# Altium footprint library Reflow3D1411sep.PcbLib: 657 footprints (part 25 of 42)
Each footprint in its own frame and in the unit in brackets; x right, y up, seen from the top. Pads: shape width x height; smd on the part's side, far side on the other; paste and mask are expansions set on the pad; w line width, h text height; cw(c..) or ccw(c..) is an arc to the next point about the centre after c.
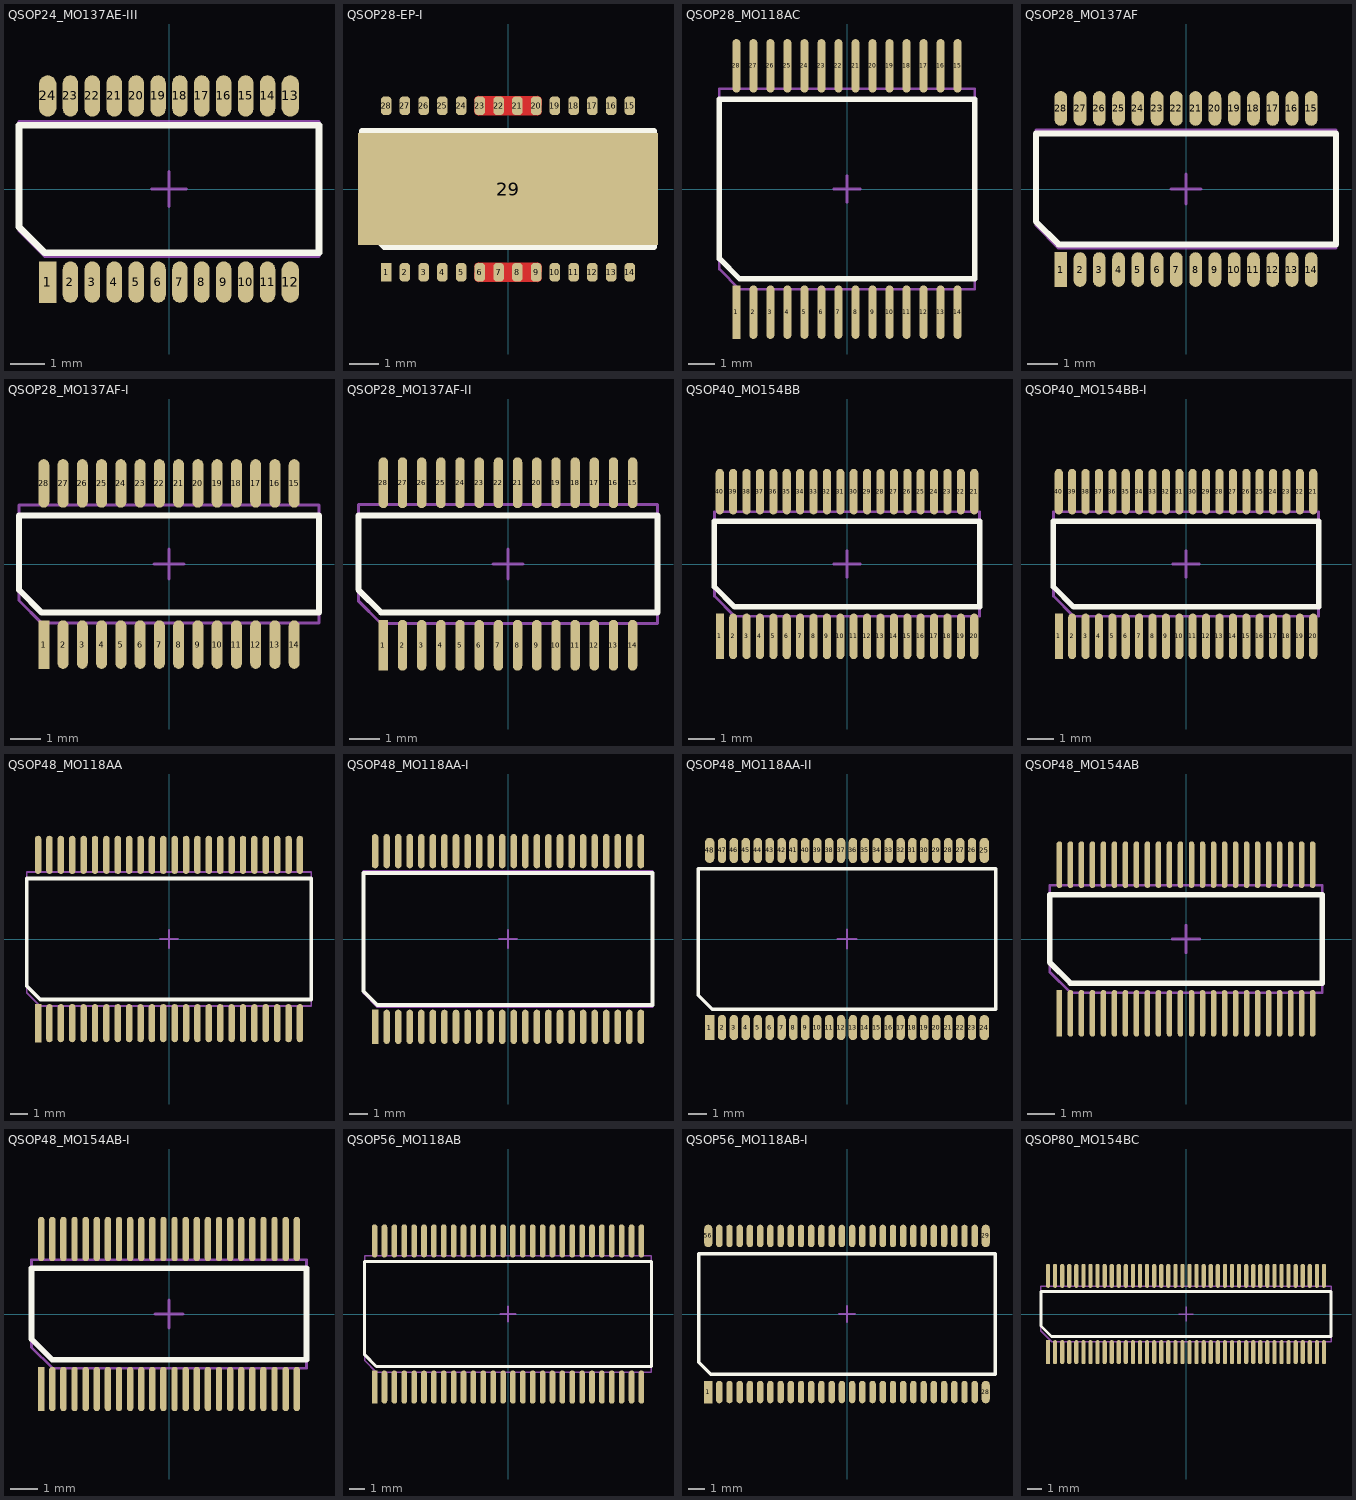
[diagram p24: the footprints below, top view; thin cyan lines are the x and y axes]

## QSOP24_MO137AE-III [mm] "www.nxp.com, sot724-1_po.pdf, SOT724-1_fp_reflow.pdf"
height 1.62
pads (24):
  rect 0.5x1.2 smd mask+0.075: 1(-3.518,-2.7)
  oval 0.45x1.2 smd mask+0.075: 2(-2.857,-2.7) 3(-2.222,-2.7) 4(-1.587,-2.7) 5(-0.953,-2.7) 6(-0.318,-2.7) 7(0.318,-2.7) 8(0.953,-2.7) 9(1.587,-2.7) 10(2.222,-2.7) 11(2.857,-2.7) 14(2.857,2.7) 15(2.222,2.7) 16(1.587,2.7) 17(0.953,2.7) 18(0.318,2.7) 19(-0.318,2.7) 20(-0.953,2.7) 21(-1.587,2.7) 22(-2.222,2.7) 23(-2.857,2.7)
  oval 0.5x1.2 smd mask+0.075: 12(3.518,-2.7) 13(3.518,2.7) 24(-3.518,2.7)
Top Overlay:
  lines w0.2: -4.35,-1.1 -4.35,1.85 4.35,1.85 4.35,-1.85 -3.6,-1.85 -4.35,-1.1
Top Solder:
  region: -0.665,-2.25 -0.665,-3.15 -0.605,-3.15 -0.605,-2.25
  region: -0.665,3.15 -0.665,2.25 -0.605,2.25 -0.605,3.15
  region: -0.03,3.15 -0.03,2.25 0.03,2.25 0.03,3.15
  region: -0.03,-2.25 -0.03,-3.15 0.03,-3.15 0.03,-2.25
  region: -3.195,-2.25 -3.195,-3.15 -3.145,-3.15 -3.145,-2.25
  region: -2.57,-2.25 -2.57,-3.15 -2.51,-3.15 -2.51,-2.25
  region: -1.935,-2.25 -1.935,-3.15 -1.875,-3.15 -1.875,-2.25
  region: 1.24,-2.25 1.24,-3.15 1.3,-3.15 1.3,-2.25
  region: 1.875,-2.25 1.875,-3.15 1.935,-3.15 1.935,-2.25
  region: 2.51,-2.25 2.51,-3.15 2.57,-3.15 2.57,-2.25
  region: -2.57,3.15 -2.57,2.25 -2.51,2.25 -2.51,3.15
  region: -1.935,3.15 -1.935,2.25 -1.875,2.25 -1.875,3.15
  region: 1.24,3.15 1.24,2.25 1.3,2.25 1.3,3.15
  region: 1.875,3.15 1.875,2.25 1.935,2.25 1.935,3.15
  region: 2.51,3.15 2.51,2.25 2.57,2.25 2.57,3.15
  region: -3.21,3.15 -3.21,2.25 -3.145,2.25 -3.145,3.15
  region: 3.21,2.25 3.21,3.15 3.145,3.15 3.145,2.25
  region: 3.21,-3.15 3.21,-2.25 3.145,-2.25 3.145,-3.15
  region: 0.605,3.15 0.605,2.25 0.665,2.25 0.665,3.15
  region: -1.3,3.15 -1.3,2.25 -1.24,2.25 -1.24,3.15
  region: 0.605,-2.25 0.605,-3.15 0.665,-3.15 0.665,-2.25
  region: -1.3,-2.25 -1.3,-3.15 -1.24,-3.15 -1.24,-2.25
Mechanical 13:
  lines w0.1: -4.35,-1.2 -3.6,-1.95 4.35,-1.95 4.35,1.95 -4.35,1.95 -4.35,-1.2
Mechanical 15:
  lines w0.1: -0.5,0 0.5,0 ; 0,-0.5 0,0.5
3D body: height 1.73, standoff 0, extent -4.4,-2 4.4,2

## QSOP28-EP-I [mm] "www.anadigics.com, Layout and Power Control for ARA05050.pdf"
height 1.6
pads (29):
  rect 0.36x0.64 smd paste-25.4 mask-25.4: 1(-4.127,-2.82)
  rrect75% 0.36x0.64 smd paste-25.4 mask-25.4: 2(-3.492,-2.82) 3(-2.857,-2.82) 4(-2.222,-2.82) 5(-1.587,-2.82) 6(-0.953,-2.82) 7(-0.318,-2.82) 8(0.318,-2.82) 9(0.953,-2.82) 10(1.587,-2.82) 11(2.222,-2.82) 12(2.857,-2.82) 13(3.492,-2.82) 14(4.127,-2.82) 15(4.127,2.82) 16(3.492,2.82) 17(2.857,2.82) 18(2.222,2.82) 19(1.587,2.82) 20(0.953,2.82) 21(0.318,2.82) 22(-0.318,2.82) 23(-0.953,2.82) 24(-1.587,2.82) 25(-2.222,2.82) 26(-2.857,2.82) 27(-3.492,2.82) 28(-4.127,2.82)
  rect 10.16x3.81 smd paste-25.4 mask-25.4: 29(0,0)
Top Layer:
  region: -1.144,2.635 -1.101,2.532 -0.998,2.489 -0.998,2.5 0.997,2.489 1.101,2.532 1.144,2.635 1.132,2.635 1.144,3.005 1.101,3.108 0.998,3.151 0.998,3.14 -0.998,3.151 -1.101,3.108 -1.144,3.005 -1.132,3.005
  region: 1.144,-2.635 1.101,-2.532 0.998,-2.489 0.998,-2.5 -0.997,-2.489 -1.101,-2.532 -1.144,-2.635 -1.132,-2.635 -1.144,-3.005 -1.101,-3.108 -0.997,-3.151 -0.997,-3.14 0.997,-3.151 1.101,-3.108 1.144,-3.005 1.132,-3.005
Top Overlay:
  lines w0.2: -4.94,-1.21 -4.94,1.96 4.94,1.96 4.94,-1.96 -4.19,-1.96 -4.94,-1.21
Top Paste:
  region: 4.283,2.525 4.283,3.05 3.972,3.05 3.972,2.525
  region: 3.647,2.525 3.647,3.05 3.337,3.05 3.337,2.525
  region: 3.012,2.525 3.012,3.05 2.702,3.05 2.702,2.525
  region: 2.377,2.525 2.377,3.05 2.067,3.05 2.067,2.525
  region: 1.742,2.525 1.742,3.05 1.432,3.05 1.432,2.525
  region: 1.108,2.525 1.108,3.05 -1.108,3.05 -1.108,2.525
  region: -1.433,2.525 -1.433,3.05 -1.743,3.05 -1.743,2.525
  region: -2.068,2.525 -2.068,3.05 -2.378,3.05 -2.378,2.525
  region: -2.703,2.525 -2.703,3.05 -3.013,3.05 -3.013,2.525
  region: -3.338,2.525 -3.338,3.05 -3.648,3.05 -3.648,2.525
  region: -3.973,2.525 -3.973,3.05 -4.283,3.05 -4.283,2.525
  region: 3.973,-2.525 3.973,-3.05 4.283,-3.05 4.283,-2.525
  region: 3.338,-2.525 3.338,-3.05 3.648,-3.05 3.648,-2.525
  region: 2.703,-2.525 2.703,-3.05 3.013,-3.05 3.013,-2.525
  region: 2.068,-2.525 2.068,-3.05 2.378,-3.05 2.378,-2.525
  region: 1.433,-2.525 1.433,-3.05 1.743,-3.05 1.743,-2.525
  region: -1.742,-2.525 -1.742,-3.05 -1.432,-3.05 -1.432,-2.525
  region: -2.377,-2.525 -2.377,-3.05 -2.067,-3.05 -2.067,-2.525
  region: -3.012,-2.525 -3.012,-3.05 -2.702,-3.05 -2.702,-2.525
  region: -3.647,-2.525 -3.647,-3.05 -3.337,-3.05 -3.337,-2.525
  region: -4.283,-2.525 -4.283,-3.05 -3.972,-3.05 -3.972,-2.525
  region: -1.525,-0.76 -1.525,0.76 1.525,0.76 1.525,-0.76
  region: -1.108,-2.525 -1.108,-3.05 1.108,-3.05 1.108,-2.525
Top Solder:
  drawing of 23 lines, arcs and shapes, not listed
Mechanical 13:
  lines w0.1: -1.525,-0.26 -1.525,-0.76 -1.025,-0.76 ; -1.525,0.26 -1.525,0.76 -1.025,0.76 ; 1.025,-0.76 1.525,-0.76 1.525,-0.26 ; 1.025,0.76 1.525,0.76 1.525,0.26 ; -4.94,-1.21 -4.94,1.96 4.94,1.96 4.94,-1.96 -4.19,-1.96 -4.94,-1.21
Mechanical 15:
  lines w0.1: -0.5,0 0.5,0 ; 0,-0.5 0,0.5
3D body: height 1.73, standoff 0, extent -4.99,-1.995 4.99,1.995

## QSOP28_MO118AC [mm] "www.ti.com, msso001c.pdf, DL28.asc; www.jedec.org, Mo-118b.pdf"
height 2.59
pads (28):
  rect 0.3x2 smd mask+0.075: 1(-4.127,-4.6)
  oval 0.3x2 smd mask+0.075: 2(-3.492,-4.6) 3(-2.857,-4.6) 4(-2.222,-4.6) 5(-1.587,-4.6) 6(-0.953,-4.6) 7(-0.318,-4.6) 8(0.318,-4.6) 9(0.953,-4.6) 10(1.587,-4.6) 11(2.222,-4.6) 12(2.857,-4.6) 13(3.492,-4.6) 14(4.127,-4.6) 15(4.127,4.6) 16(3.492,4.6) 17(2.857,4.6) 18(2.222,4.6) 19(1.587,4.6) 20(0.953,4.6) 21(0.318,4.6) 22(-0.318,4.6) 23(-0.953,4.6) 24(-1.587,4.6) 25(-2.222,4.6) 26(-2.857,4.6) 27(-3.492,4.6) 28(-4.127,4.6)
Top Overlay:
  lines w0.2: -4.765,-2.6 -4.015,-3.35 4.765,-3.35 4.765,3.35 -4.765,3.35 -4.765,-2.6
Mechanical 13:
  lines w0.1: -4.765,-2.995 -4.015,-3.745 4.765,-3.745 4.765,3.745 -4.765,3.745 -4.765,-2.995
Mechanical 15:
  lines w0.1: -0.5,0 0.5,0 ; 0,-0.5 0,0.5
3D body: height 2.79, standoff 0, extent -4.825,-3.795 4.825,3.795

## QSOP28_MO137AF [mm] "www.linear.com, SSOP_28_05-08-1641.pdf; www.jedec.org, mo-187e.pdf"
height 1.55
pads (28):
  rect 0.42x1.14 smd mask+0.05: 1(-4.127,-2.655)
  oval 0.42x1.14 smd mask+0.05: 2(-3.492,-2.655) 3(-2.857,-2.655) 4(-2.222,-2.655) 5(-1.587,-2.655) 6(-0.953,-2.655) 7(-0.318,-2.655) 8(0.318,-2.655) 9(0.953,-2.655) 10(1.587,-2.655) 11(2.222,-2.655) 12(2.857,-2.655) 13(3.492,-2.655) 14(4.127,-2.655) 15(4.127,2.655) 16(3.492,2.655) 17(2.857,2.655) 18(2.222,2.655) 19(1.587,2.655) 20(0.953,2.655) 21(0.318,2.655) 22(-0.318,2.655) 23(-0.953,2.655) 24(-1.587,2.655) 25(-2.222,2.655) 26(-2.857,2.655) 27(-3.492,2.655) 28(-4.127,2.655)
Top Overlay:
  lines w0.2: -4.945,-1.075 -4.945,1.825 4.945,1.825 4.945,-1.825 -4.195,-1.825 -4.945,-1.075
Mechanical 13:
  lines w0.1: -4.945,-1.2 -4.945,1.95 4.945,1.95 4.945,-1.95 -4.195,-1.95 -4.945,-1.2
Mechanical 15:
  lines w0.1: -0.5,0 0.5,0 ; 0,-0.5 0,0.5
3D body: height 1.75, standoff 0, extent -4.99,-1.995 4.99,1.995

## QSOP28_MO137AF-I [mm] "www.maxim-ic.com, 21-0055.PDF, 90-0173.PDF"
height 1.55
pads (28):
  rect 0.36x1.6 smd mask+0.075: 1(-4.127,-2.655)
  oval 0.36x1.6 smd mask+0.075: 2(-3.492,-2.655) 3(-2.857,-2.655) 4(-2.222,-2.655) 5(-1.587,-2.655) 6(-0.953,-2.655) 7(-0.318,-2.655) 8(0.318,-2.655) 9(0.953,-2.655) 10(1.587,-2.655) 11(2.222,-2.655) 12(2.857,-2.655) 13(3.492,-2.655) 14(4.127,-2.655) 15(4.127,2.655) 16(3.492,2.655) 17(2.857,2.655) 18(2.222,2.655) 19(1.587,2.655) 20(0.953,2.655) 21(0.318,2.655) 22(-0.318,2.655) 23(-0.953,2.655) 24(-1.587,2.655) 25(-2.222,2.655) 26(-2.857,2.655) 27(-3.492,2.655) 28(-4.127,2.655)
Top Overlay:
  lines w0.2: -4.945,-0.85 -4.195,-1.6 4.945,-1.6 4.945,1.6 -4.945,1.6 -4.945,-0.85
Mechanical 13:
  lines w0.1: -4.945,-1.2 -4.195,-1.95 4.945,-1.95 4.945,1.95 -4.945,1.95 -4.945,-1.2
Mechanical 15:
  lines w0.1: -0.5,0 0.5,0 ; 0,-0.5 0,0.5
3D body: height 1.75, standoff 0, extent -4.99,-1.995 4.99,1.995

## QSOP28_MO137AF-II [mm] "www.idt.com, PSC4040.pdf"
height 1.63
pads (28):
  rect 0.31x1.68 smd mask+0.075: 1(-4.127,-2.69)
  oval 0.31x1.68 smd mask+0.075: 2(-3.492,-2.69) 3(-2.857,-2.69) 4(-2.222,-2.69) 5(-1.587,-2.69) 6(-0.953,-2.69) 7(-0.318,-2.69) 8(0.318,-2.69) 9(0.953,-2.69) 10(1.587,-2.69) 11(2.222,-2.69) 12(2.857,-2.69) 13(3.492,-2.69) 14(4.127,-2.69) 15(4.127,2.69) 16(3.492,2.69) 17(2.857,2.69) 18(2.222,2.69) 19(1.587,2.69) 20(0.953,2.69) 21(0.318,2.69) 22(-0.318,2.69) 23(-0.953,2.69) 24(-1.587,2.69) 25(-2.222,2.69) 26(-2.857,2.69) 27(-3.492,2.69) 28(-4.127,2.69)
Top Overlay:
  lines w0.2: -4.955,-0.85 -4.955,1.6 4.955,1.6 4.955,-1.6 -4.205,-1.6 -4.955,-0.85
Mechanical 13:
  lines w0.1: -4.955,-1.22 -4.955,1.97 4.955,1.97 4.955,-1.97 -4.205,-1.97 -4.955,-1.22
Mechanical 15:
  lines w0.1: -0.5,0 0.5,0 ; 0,-0.5 0,0.5
3D body: height 1.73, standoff 0, extent -5.005,-1.995 5.005,1.995

## QSOP40_MO154BB [mm] "www.idt.com, PSC4078.pdf; www.jedec.org, Mo-154c.pdf"
height 1.75
pads (40):
  rect 0.3x1.7 smd mask+0.05: 1(-4.75,-2.7)
  oval 0.3x1.7 smd mask+0.05: 2(-4.25,-2.7) 3(-3.75,-2.7) 4(-3.25,-2.7) 5(-2.75,-2.7) 6(-2.25,-2.7) 7(-1.75,-2.7) 8(-1.25,-2.7) 9(-0.75,-2.7) 10(-0.25,-2.7) 11(0.25,-2.7) 12(0.75,-2.7) 13(1.25,-2.7) 14(1.75,-2.7) 15(2.25,-2.7) 16(2.75,-2.7) 17(3.25,-2.7) 18(3.75,-2.7) 19(4.25,-2.7) 20(4.75,-2.7) 21(4.75,2.7) 22(4.25,2.7) 23(3.75,2.7) 24(3.25,2.7) 25(2.75,2.7) 26(2.25,2.7) 27(1.75,2.7) 28(1.25,2.7) 29(0.75,2.7) 30(0.25,2.7) 31(-0.25,2.7) 32(-0.75,2.7) 33(-1.25,2.7) 34(-1.75,2.7) 35(-2.25,2.7) 36(-2.75,2.7) 37(-3.25,2.7) 38(-3.75,2.7) 39(-4.25,2.7) 40(-4.75,2.7)
Top Overlay:
  lines w0.2: -4.95,-0.85 -4.95,1.6 4.95,1.6 4.95,-1.6 -4.2,-1.6 -4.95,-0.85
Mechanical 13:
  lines w0.1: -4.95,-1.2 -4.95,1.95 4.95,1.95 4.95,-1.95 -4.2,-1.95 -4.95,-1.2
Mechanical 15:
  lines w0.1: -0.5,0 0.5,0 ; 0,-0.5 0,0.5
3D body: height 2, standoff 0, extent -5,-2 5,2

## QSOP40_MO154BB-I [mm] "www.idt.com, PSC4078.pdf; www.pericom.com, B40.pdf"
height 1.6
pads (40):
  rect 0.3x1.7 smd mask+0.05: 1(-4.75,-2.7)
  oval 0.3x1.7 smd mask+0.05: 2(-4.25,-2.7) 3(-3.75,-2.7) 4(-3.25,-2.7) 5(-2.75,-2.7) 6(-2.25,-2.7) 7(-1.75,-2.7) 8(-1.25,-2.7) 9(-0.75,-2.7) 10(-0.25,-2.7) 11(0.25,-2.7) 12(0.75,-2.7) 13(1.25,-2.7) 14(1.75,-2.7) 15(2.25,-2.7) 16(2.75,-2.7) 17(3.25,-2.7) 18(3.75,-2.7) 19(4.25,-2.7) 20(4.75,-2.7) 21(4.75,2.7) 22(4.25,2.7) 23(3.75,2.7) 24(3.25,2.7) 25(2.75,2.7) 26(2.25,2.7) 27(1.75,2.7) 28(1.25,2.7) 29(0.75,2.7) 30(0.25,2.7) 31(-0.25,2.7) 32(-0.75,2.7) 33(-1.25,2.7) 34(-1.75,2.7) 35(-2.25,2.7) 36(-2.75,2.7) 37(-3.25,2.7) 38(-3.75,2.7) 39(-4.25,2.7) 40(-4.75,2.7)
Top Overlay:
  lines w0.2: -4.95,-0.85 -4.95,1.6 4.95,1.6 4.95,-1.6 -4.2,-1.6 -4.95,-0.85
Mechanical 13:
  lines w0.1: -4.95,-1.2 -4.95,1.95 4.95,1.95 4.95,-1.95 -4.2,-1.95 -4.95,-1.2
Mechanical 15:
  lines w0.1: -0.5,0 0.5,0 ; 0,-0.5 0,0.5
3D body: height 1.73, standoff 0, extent -5,-2 5,2

## QSOP48_MO118AA [mm] "www.idt.com, PSC4029.pdf; www.jedec.org, Mo-118b.pdf"
height 2.59
pads (48):
  rect 0.36x2.13 smd mask+0.075: 1(-7.302,-4.695)
  oval 0.36x2.13 smd mask+0.075: 2(-6.667,-4.695) 3(-6.032,-4.695) 4(-5.397,-4.695) 5(-4.763,-4.695) 6(-4.127,-4.695) 7(-3.492,-4.695) 8(-2.857,-4.695) 9(-2.222,-4.695) 10(-1.587,-4.695) 11(-0.953,-4.695) 12(-0.318,-4.695) 13(0.318,-4.695) 14(0.953,-4.695) 15(1.587,-4.695) 16(2.222,-4.695) 17(2.857,-4.695) 18(3.492,-4.695) 19(4.127,-4.695) 20(4.763,-4.695) 21(5.397,-4.695) 22(6.033,-4.695) 23(6.667,-4.695) 24(7.302,-4.695) 25(7.302,4.695) 26(6.667,4.695) 27(6.032,4.695) 28(5.397,4.695) 29(4.763,4.695) 30(4.127,4.695) 31(3.492,4.695) 32(2.857,4.695) 33(2.222,4.695) 34(1.587,4.695) 35(0.953,4.695) 36(0.318,4.695) 37(-0.318,4.695) 38(-0.953,4.695) 39(-1.587,4.695) 40(-2.222,4.695) 41(-2.857,4.695) 42(-3.492,4.695) 43(-4.127,4.695) 44(-4.763,4.695) 45(-5.397,4.695) 46(-6.032,4.695) 47(-6.667,4.695) 48(-7.302,4.695)
Top Overlay:
  lines w0.2: -7.94,-2.625 -7.19,-3.375 7.94,-3.375 7.94,3.375 -7.94,3.375 -7.94,-2.625
Mechanical 13:
  lines w0.1: -7.94,-2.995 -7.94,3.745 7.94,3.745 7.94,-3.745 -7.19,-3.745 -7.94,-2.995
Mechanical 15:
  lines w0.1: -0.5,0 0.5,0 ; 0,-0.5 0,0.5
3D body: height 2.79, standoff 0, extent -8,-3.8 8,3.8

## QSOP48_MO118AA-I [mm] "www.national.com, ms48a.pdf"
height 2.59
pads (48):
  rect 0.36x1.88 smd mask+0.075: 1(-7.302,-4.825)
  oval 0.36x1.88 smd mask+0.075: 2(-6.667,-4.825) 3(-6.032,-4.825) 4(-5.397,-4.825) 5(-4.763,-4.825) 6(-4.127,-4.825) 7(-3.492,-4.825) 8(-2.857,-4.825) 9(-2.222,-4.825) 10(-1.587,-4.825) 11(-0.953,-4.825) 12(-0.318,-4.825) 13(0.318,-4.825) 14(0.953,-4.825) 15(1.587,-4.825) 16(2.222,-4.825) 17(2.857,-4.825) 18(3.492,-4.825) 19(4.127,-4.825) 20(4.763,-4.825) 21(5.397,-4.825) 22(6.033,-4.825) 23(6.667,-4.825) 24(7.302,-4.825) 25(7.302,4.825) 26(6.667,4.825) 27(6.032,4.825) 28(5.397,4.825) 29(4.763,4.825) 30(4.127,4.825) 31(3.492,4.825) 32(2.857,4.825) 33(2.222,4.825) 34(1.587,4.825) 35(0.953,4.825) 36(0.318,4.825) 37(-0.318,4.825) 38(-0.953,4.825) 39(-1.587,4.825) 40(-2.222,4.825) 41(-2.857,4.825) 42(-3.492,4.825) 43(-4.127,4.825) 44(-4.763,4.825) 45(-5.397,4.825) 46(-6.032,4.825) 47(-6.667,4.825) 48(-7.302,4.825)
Top Overlay:
  lines w0.2: -7.94,-2.875 -7.94,3.625 7.94,3.625 7.94,-3.625 -7.19,-3.625 -7.94,-2.875
Mechanical 13:
  lines w0.1: -7.94,-2.995 -7.19,-3.745 7.94,-3.745 7.94,3.745 -7.94,3.745 -7.94,-2.995
Mechanical 15:
  lines w0.1: -0.5,0 0.5,0 ; 0,-0.5 0,0.5
3D body: height 2.74, standoff 0, extent -8,-3.795 8,3.795

## QSOP48_MO118AA-II [mm] "www.nxp.com, sot370-1_po.pdf, SOT370-1_fp_reflow.pdf"
height 2.6
pads (48):
  rect 0.5x1.35 smd mask+0.075: 1(-7.328,-4.725)
  oval 0.45x1.35 smd mask+0.075: 2(-6.667,-4.725) 3(-6.032,-4.725) 4(-5.397,-4.725) 5(-4.763,-4.725) 6(-4.127,-4.725) 7(-3.492,-4.725) 8(-2.857,-4.725) 9(-2.222,-4.725) 10(-1.587,-4.725) 11(-0.953,-4.725) 12(-0.318,-4.725) 13(0.318,-4.725) 14(0.953,-4.725) 15(1.587,-4.725) 16(2.222,-4.725) 17(2.857,-4.725) 18(3.492,-4.725) 19(4.127,-4.725) 20(4.763,-4.725) 21(5.397,-4.725) 22(6.033,-4.725) 23(6.667,-4.725) 26(6.667,4.725) 27(6.032,4.725) 28(5.397,4.725) 29(4.763,4.725) 30(4.127,4.725) 31(3.492,4.725) 32(2.857,4.725) 33(2.222,4.725) 34(1.587,4.725) 35(0.953,4.725) 36(0.318,4.725) 37(-0.318,4.725) 38(-0.953,4.725) 39(-1.587,4.725) 40(-2.222,4.725) 41(-2.857,4.725) 42(-3.492,4.725) 43(-4.127,4.725) 44(-4.763,4.725) 45(-5.397,4.725) 46(-6.032,4.725) 47(-6.667,4.725)
  oval 0.5x1.35 smd mask+0.075: 24(7.328,-4.725) 25(7.328,4.725) 48(-7.328,4.725)
Top Overlay:
  lines w0.2: -7.94,-3 -7.19,-3.75 7.94,-3.75 7.94,3.75 -7.94,3.75 -7.94,-3
Top Solder:
  drawing of 46 lines, arcs and shapes, not listed
Mechanical 13:
  lines w0.1: -7.94,-3 -7.19,-3.75 7.94,-3.75 7.94,3.75 -7.94,3.75 -7.94,-3
Mechanical 15:
  lines w0.1: -0.5,0 0.5,0 ; 0,-0.5 0,0.5
3D body: height 2.8, standoff 0, extent -8,-3.8 8,3.8

## QSOP48_MO154AB [mm] "www.idt.com, PSC4077.pdf; www.jedec.org, Mo-154c.pdf"
height 1.75
pads (48):
  rect 0.2x1.7 smd mask+0.05: 1(-4.6,-2.7)
  oval 0.2x1.7 smd mask+0.05: 2(-4.2,-2.7) 3(-3.8,-2.7) 4(-3.4,-2.7) 5(-3,-2.7) 6(-2.6,-2.7) 7(-2.2,-2.7) 8(-1.8,-2.7) 9(-1.4,-2.7) 10(-1,-2.7) 11(-0.6,-2.7) 12(-0.2,-2.7) 13(0.2,-2.7) 14(0.6,-2.7) 15(1,-2.7) 16(1.4,-2.7) 17(1.8,-2.7) 18(2.2,-2.7) 19(2.6,-2.7) 20(3,-2.7) 21(3.4,-2.7) 22(3.8,-2.7) 23(4.2,-2.7) 24(4.6,-2.7) 25(4.6,2.7) 26(4.2,2.7) 27(3.8,2.7) 28(3.4,2.7) 29(3,2.7) 30(2.6,2.7) 31(2.2,2.7) 32(1.8,2.7) 33(1.4,2.7) 34(1,2.7) 35(0.6,2.7) 36(-0.6,2.7) 36(0.2,2.7) 37(-1,2.7) 37(-0.2,2.7) 40(-1.4,2.7) 41(-1.8,2.7) 42(-2.2,2.7) 43(-2.6,2.7) 44(-3,2.7) 45(-3.4,2.7) 46(-3.8,2.7) 47(-4.2,2.7) 48(-4.6,2.7)
Top Overlay:
  lines w0.2: -4.95,-0.85 -4.2,-1.6 4.95,-1.6 4.95,1.6 -4.95,1.6 -4.95,-0.85
Mechanical 13:
  lines w0.1: -4.95,-1.2 -4.2,-1.95 4.95,-1.95 4.95,1.95 -4.95,1.95 -4.95,-1.2
Mechanical 15:
  lines w0.1: -0.5,0 0.5,0 ; 0,-0.5 0,0.5
3D body: height 2, standoff 0, extent -5,-2 5,2

## QSOP48_MO154AB-I [mm] "www.pericom.com, B48.pdf; www.jedec.org, Mo-154c.pdf"
height 1.75
pads (48):
  rect 0.23x1.6 smd mask+0.085: 1(-4.6,-2.7)
  oval 0.23x1.6 smd mask+0.085: 2(-4.2,-2.7) 3(-3.8,-2.7) 4(-3.4,-2.7) 5(-3,-2.7) 6(-2.6,-2.7) 7(-2.2,-2.7) 8(-1.8,-2.7) 9(-1.4,-2.7) 10(-1,-2.7) 11(-0.6,-2.7) 12(-0.2,-2.7) 13(0.2,-2.7) 14(0.6,-2.7) 15(1,-2.7) 16(1.4,-2.7) 17(1.8,-2.7) 18(2.2,-2.7) 19(2.6,-2.7) 20(3,-2.7) 21(3.4,-2.7) 22(3.8,-2.7) 23(4.2,-2.7) 24(4.6,-2.7) 25(4.6,2.7) 26(4.2,2.7) 27(3.8,2.7) 28(3.4,2.7) 29(3,2.7) 30(2.6,2.7) 31(2.2,2.7) 32(1.8,2.7) 33(1.4,2.7) 34(1,2.7) 35(0.6,2.7) 36(-0.6,2.7) 36(0.2,2.7) 37(-1,2.7) 37(-0.2,2.7) 40(-1.4,2.7) 41(-1.8,2.7) 42(-2.2,2.7) 43(-2.6,2.7) 44(-3,2.7) 45(-3.4,2.7) 46(-3.8,2.7) 47(-4.2,2.7) 48(-4.6,2.7)
Top Overlay:
  lines w0.2: -4.95,-0.9 -4.95,1.65 4.95,1.65 4.95,-1.65 -4.2,-1.65 -4.95,-0.9
Mechanical 13:
  lines w0.1: -4.95,-1.2 -4.95,1.95 4.95,1.95 4.95,-1.95 -4.2,-1.95 -4.95,-1.2
Mechanical 15:
  lines w0.1: -0.5,0 0.5,0 ; 0,-0.5 0,0.5
3D body: height 2, standoff 0, extent -5,-2 5,2

## QSOP56_MO118AB [mm] "www.idt.com, PSC4029.pdf; www.jedec.org, Mo-118b.pdf"
height 2.59
pads (56):
  rect 0.36x2.13 smd mask+0.075: 1(-8.572,-4.695)
  oval 0.36x2.13 smd mask+0.075: 2(-7.938,-4.695) 3(-7.302,-4.695) 4(-6.667,-4.695) 5(-6.032,-4.695) 6(-5.397,-4.695) 7(-4.763,-4.695) 8(-4.127,-4.695) 9(-3.492,-4.695) 10(-2.857,-4.695) 11(-2.222,-4.695) 12(-1.587,-4.695) 13(-0.953,-4.695) 15(0.318,-4.695) 16(0.952,-4.695) 17(1.587,-4.695) 18(2.222,-4.695) 19(2.857,-4.695) 20(3.492,-4.695) 21(4.127,-4.695) 22(4.763,-4.695) 23(5.397,-4.695) 24(6.032,-4.695) 25(6.667,-4.695) 26(7.302,-4.695) 27(7.938,-4.695) 28(8.572,-4.695) 29(8.572,4.695) 30(7.937,4.695) 31(7.302,4.695) 32(6.667,4.695) 33(6.032,4.695) 34(5.397,4.695) 35(4.762,4.695) 36(4.127,4.695) 37(3.492,4.695) 38(2.857,4.695) 39(2.222,4.695) 40(1.587,4.695) 41(0.952,4.695) 42(0.317,4.695) 43(-0.318,4.695) 44(-0.953,4.695) 45(-1.588,4.695) 46(-2.223,4.695) 47(-2.858,4.695) 48(-3.493,4.695) 49(-4.128,4.695) 50(-4.763,4.695) 51(-5.398,4.695) 52(-6.033,4.695) 53(-6.668,4.695) 54(-7.303,4.695) 55(-7.938,4.695) 56(-8.573,4.695)
  oval 0.36x2.13 smd: 14(-0.318,-4.695)
Top Overlay:
  lines w0.2: -9.21,-2.625 -9.21,3.375 9.21,3.375 9.21,-3.375 -8.46,-3.375 -9.21,-2.625
Mechanical 13:
  lines w0.1: -9.21,-2.995 -8.46,-3.745 9.21,-3.745 9.21,3.745 -9.21,3.745 -9.21,-2.995
Mechanical 15:
  lines w0.1: -0.5,0 0.5,0 ; 0,-0.5 0,0.5
3D body: height 2.79, standoff 0, extent -9.27,-3.8 9.27,3.8

## QSOP56_MO118AB-I [mm] "www.nxp.com, sot371-1_po.pdf, SOT371-1_fp_reflow.pdf"
height 2.6
pads (56):
  rect 0.5x1.4 smd mask+0.05: 1(-8.622,-4.85)
  oval 0.4x1.4 smd mask+0.05: 2(-7.938,-4.85) 3(-7.302,-4.85) 4(-6.667,-4.85) 5(-6.032,-4.85) 6(-5.397,-4.85) 7(-4.763,-4.85) 8(-4.127,-4.85) 9(-3.492,-4.85) 10(-2.857,-4.85) 11(-2.222,-4.85) 12(-1.587,-4.85) 13(-0.953,-4.85) 14(-0.318,-4.85) 15(0.318,-4.85) 16(0.952,-4.85) 17(1.587,-4.85) 18(2.222,-4.85) 19(2.857,-4.85) 20(3.492,-4.85) 21(4.127,-4.85) 22(4.763,-4.85) 23(5.397,-4.85) 24(6.032,-4.85) 25(6.667,-4.85) 26(7.302,-4.85) 27(7.938,-4.85) 30(7.937,4.85) 31(7.302,4.85) 32(6.667,4.85) 33(6.032,4.85) 34(5.397,4.85) 35(4.762,4.85) 36(4.127,4.85) 37(3.492,4.85) 38(2.857,4.85) 39(2.222,4.85) 40(1.587,4.85) 41(0.952,4.85) 42(0.317,4.85) 43(-0.318,4.85) 44(-0.953,4.85) 45(-1.588,4.85) 46(-2.223,4.85) 47(-2.858,4.85) 48(-3.493,4.85) 49(-4.128,4.85) 50(-4.763,4.85) 51(-5.398,4.85) 52(-6.033,4.85) 53(-6.668,4.85) 54(-7.303,4.85) 55(-7.938,4.85)
  oval 0.5x1.4 smd mask+0.05: 28(8.622,-4.85) 29(8.622,4.85) 56(-8.623,4.85)
Top Overlay:
  lines w0.2: -9.215,-3 -9.215,3.75 9.215,3.75 9.215,-3.75 -8.465,-3.75 -9.215,-3
Mechanical 13:
  lines w0.1: -9.215,-3 -8.465,-3.75 9.215,-3.75 9.215,3.75 -9.215,3.75 -9.215,-3
Mechanical 15:
  lines w0.1: -0.5,0 0.5,0 ; 0,-0.5 0,0.5
3D body: height 2.8, standoff 0, extent -9.275,-3.8 9.275,3.8

## QSOP80_MO154BC [mm] "www.idt.com, PSC4078.pdf; www.jedec.org, Mo-154c.pdf"
height 1.75
pads (80):
  rect 0.3x1.7 smd mask+0.05: 1(-9.75,-2.7)
  oval 0.3x1.7 smd mask+0.05: 2(-9.25,-2.7) 3(-8.75,-2.7) 4(-8.25,-2.7) 5(-7.75,-2.7) 6(-7.25,-2.7) 7(-6.75,-2.7) 8(-6.25,-2.7) 9(-5.75,-2.7) 10(-5.25,-2.7) 11(-4.75,-2.7) 12(-4.25,-2.7) 13(-3.75,-2.7) 14(-3.25,-2.7) 15(-2.75,-2.7) 16(-2.25,-2.7) 17(-1.75,-2.7) 18(-1.25,-2.7) 19(-0.75,-2.7) 20(-0.25,-2.7) 21(0.25,-2.7) 22(0.75,-2.7) 23(1.25,-2.7) 24(1.75,-2.7) 25(2.25,-2.7) 26(2.75,-2.7) 27(3.25,-2.7) 28(3.75,-2.7) 29(4.25,-2.7) 30(4.75,-2.7) 31(5.25,-2.7) 32(5.75,-2.7) 33(6.25,-2.7) 34(6.75,-2.7) 35(7.25,-2.7) 36(7.75,-2.7) 37(8.25,-2.7) 38(8.75,-2.7) 39(9.25,-2.7) 40(9.75,-2.7) 41(9.75,2.7) 42(9.25,2.7) 43(8.75,2.7) 44(8.25,2.7) 45(7.75,2.7) 46(7.25,2.7) 47(6.75,2.7) 48(6.25,2.7) 49(5.75,2.7) 50(5.25,2.7) 51(4.75,2.7) 52(4.25,2.7) 53(3.75,2.7) 54(3.25,2.7) 55(2.75,2.7) 56(2.25,2.7) 57(1.75,2.7) 58(1.25,2.7) 59(0.75,2.7) 60(0.25,2.7) 61(-0.25,2.7) 62(-0.75,2.7) 63(-1.25,2.7) 64(-1.75,2.7) 65(-2.25,2.7) 66(-2.75,2.7) 67(-3.25,2.7) 68(-3.75,2.7) 69(-4.25,2.7) 70(-4.75,2.7) 71(-5.25,2.7) 72(-5.75,2.7) 73(-6.25,2.7) 74(-6.75,2.7) 75(-7.25,2.7) 76(-7.75,2.7) 77(-8.25,2.7) 78(-8.75,2.7) 79(-9.25,2.7) 80(-9.75,2.7)
Top Overlay:
  lines w0.2: -10.25,-0.85 -9.5,-1.6 10.25,-1.6 10.25,1.6 -10.25,1.6 -10.25,-0.85
Mechanical 13:
  lines w0.1: -10.25,-1.2 -9.5,-1.95 10.25,-1.95 10.25,1.95 -10.25,1.95 -10.25,-1.2
Mechanical 15:
  lines w0.1: -0.5,0 0.5,0 ; 0,-0.5 0,0.5
3D body: height 2, standoff 0, extent -10.3,-2 10.3,2